# Altium footprint library ref-packages-longpad.PCBLIB: 1527 footprints (part 12 of 103)
Each footprint in its own frame and in the unit in brackets; x right, y up, seen from the top. Pads: shape width x height; smd on the part's side, far side on the other; paste and mask are expansions set on the pad; w line width, h text height; cw(c..) or ccw(c..) is an arc to the next point about the centre after c.
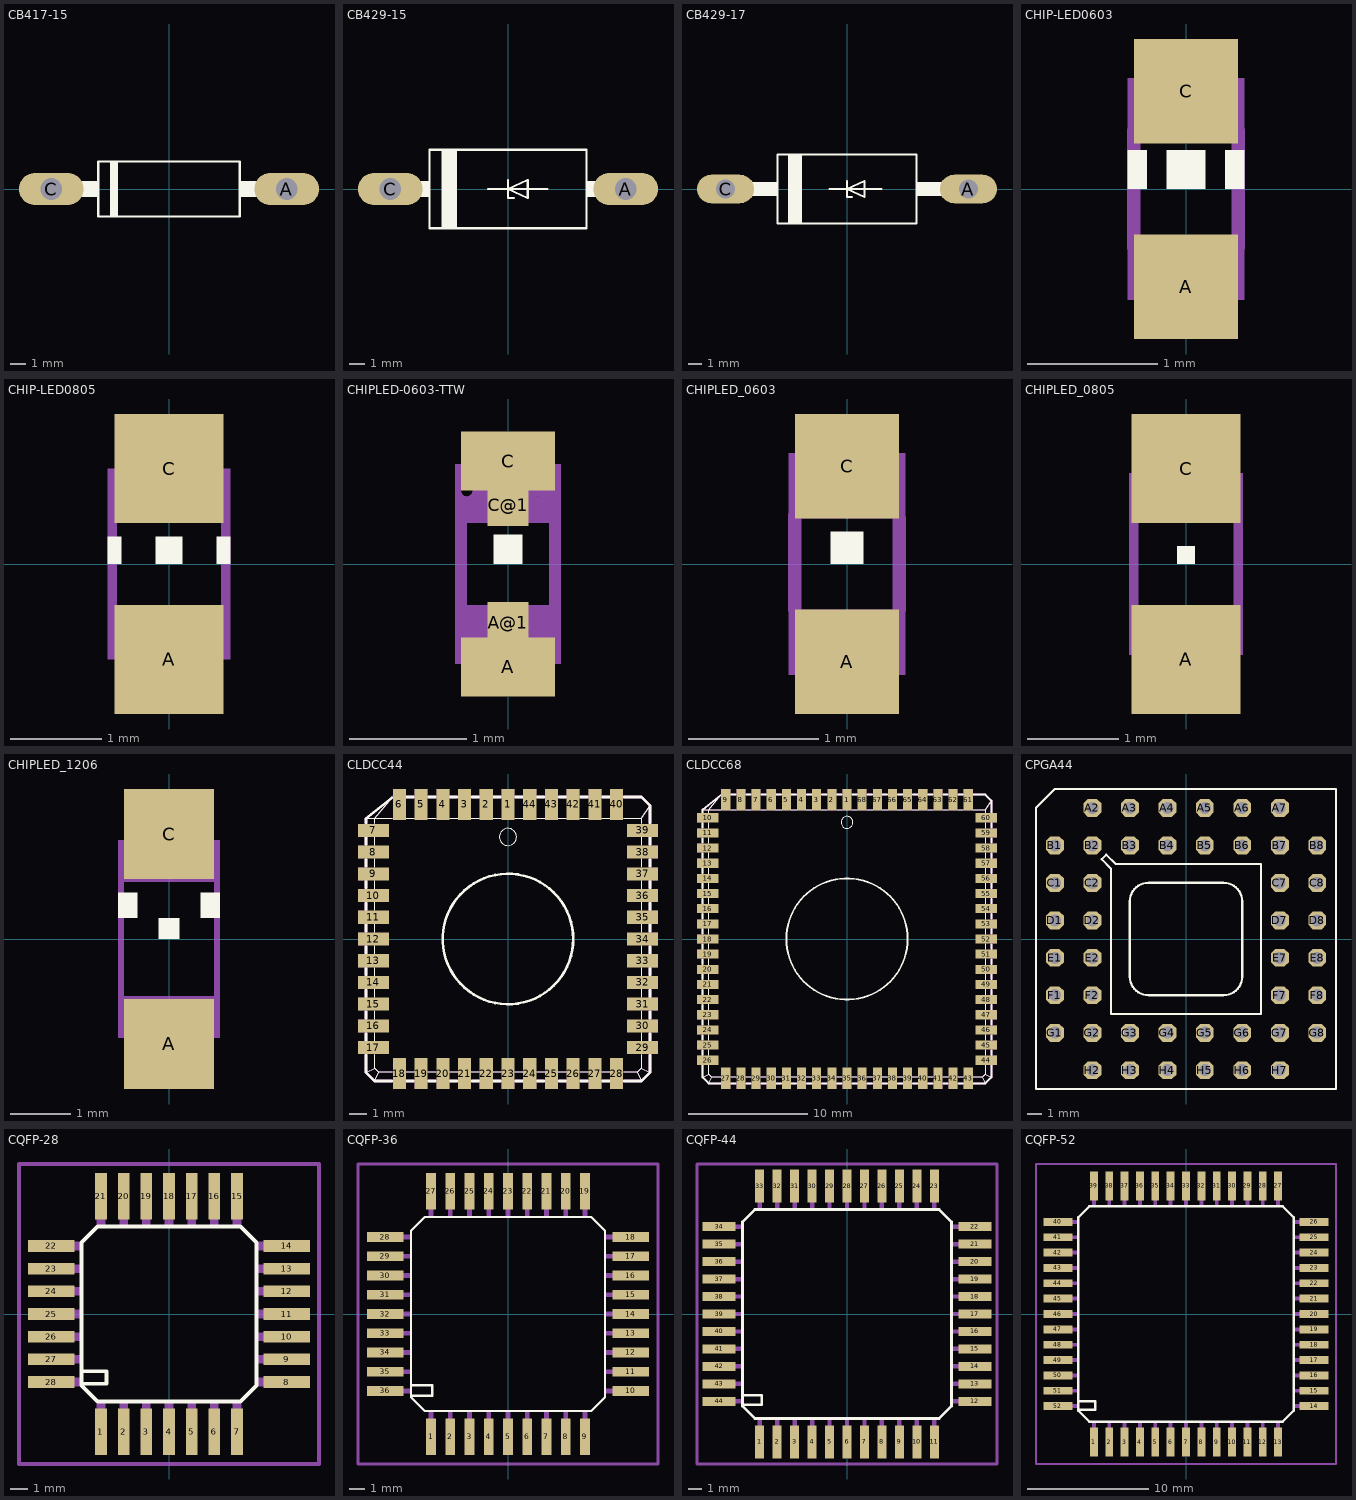
[diagram p11: the footprints below, top view; thin cyan lines are the x and y axes]

## CB417-15 [mil]
pads (2):
  oval 165x82.5 hole 55: A(300,0) C(-300,0)
Top Overlay:
  rectangle: -150,-70 -130,70
  rectangle: 180,-21 245,21
  rectangle: -245,-21 -180,21
  lines w6: -180,-70 -180,70 180,70 180,-70 -180,-70
Mechanical 16:
  lines w44: -300,0 -250,0 ; 250,0 300,0

## CB429-15 [mil]
pads (2):
  oval 165x82.5 hole 55: A(300,0) C(-300,0)
Top Overlay:
  rectangle: -170,-100 -130,100
  rectangle: -235,-20 -200,20
  rectangle: 200,-20 235,20
  lines w6: -50,0 0,0 ; 0,23 0,0 ; 15,-23 0,-23 0,0 ; 100,0 0,0 ; 0,0 50,23 50,-23 0,0 ; -200,-100 -200,100 200,100 200,-100 -200,-100
Mechanical 16:
  lines w40: -300,0 -240,0 ; 240,0 300,0

## CB429-17 [mil]
pads (2):
  oval 165x82.5 hole 55: A(350,0) C(-350,0)
Top Overlay:
  rectangle: -170,-100 -130,100
  rectangle: 200,-20 285,20
  rectangle: -285,-20 -200,20
  lines w6: -50,0 0,0 ; 0,23 0,0 ; 15,-23 0,-23 0,0 ; 100,0 0,0 ; 0,0 50,23 50,-23 0,0 ; -200,-100 -200,100 200,100 200,-100 -200,-100
Mechanical 16:
  lines w40: -350,0 -290,0 ; 290,0 350,0

## CHIP-LED0603 [mil]
pads (2):
  rect 31.5x31.5 smd: A(0,-29.53) C(0,29.53)
Top Overlay:
  rectangle: -17.72,0 -11.81,11.81
  rectangle: 11.81,0 17.72,11.81
  rectangle: -5.91,0 5.91,11.81
Mechanical 16:
  rectangle: -17.72,17.72 17.72,33.46
  rectangle: -17.72,-33.46 17.72,-17.72
  lines w4: -15.75,-17.72 -15.75,17.72 ; 15.75,-17.72 15.75,17.72

## CHIP-LED0805 [mil]
pads (2):
  rect 47.24x47.24 smd: A(0,-41.34) C(0,41.34)
Top Overlay:
  rectangle: -26.57,0 -20.67,11.81
  rectangle: 20.67,0 26.57,11.81
  rectangle: -5.91,0 5.91,11.81
Mechanical 16:
  rectangle: -26.57,17.72 26.57,41.34
  rectangle: -26.57,-41.34 26.57,-17.72
  lines w4: -24.61,-17.72 -24.61,17.72 ; 24.61,-18.7 24.61,17.72

## CHIPLED-0603-TTW [mm]
pads (4):
  rect 0.8x0.5 smd: A(0,-0.875) C(0,0.875)
  rect 0.35x0.35 smd: A@1(0,-0.5) C@1(0,0.5)
Top Overlay:
  rectangle: -0.125,0 0.125,0.25
Top Solder:
  rectangle: -0.175,0.325 0.175,0.7
  rectangle: -0.4,0.625 0.4,1.125
  rectangle: -0.4,-1.125 0.4,-0.625
  rectangle: -0.175,-0.675 0.175,-0.325
Mechanical 16:
  circle w0.051: c-0.35,0.625 r0.075
  rectangle: -0.45,0.7 -0.25,0.85
  rectangle: -0.275,0.55 -0.225,0.6
  rectangle: -0.45,0.35 -0.4,0.725
  rectangle: 0.25,0.55 0.45,0.85
  rectangle: -0.45,0.35 0.45,0.575
  rectangle: -0.45,-0.85 -0.25,-0.35
  rectangle: 0.25,-0.85 0.45,-0.35
  rectangle: -0.275,-0.575 0.275,-0.35
  rectangle: -0.275,-0.65 -0.175,-0.55
  rectangle: 0.175,-0.65 0.275,-0.55
  lines w0.051: -0.275,-0.825 cw(c0,-0.825) 0.275,-0.825
  lines w0.102: -0.4,-0.35 -0.4,0.375 ; -0.3,0.8 ccw(c0,0.826) 0.3,0.8 ; 0.4,-0.35 0.4,0.35

## CHIPLED_0603 [mil]
pads (2):
  rect 31.5x31.5 smd: A(0,-29.53) C(0,29.53)
Top Overlay:
  rectangle: -4.92,0 4.92,9.84
Mechanical 16:
  circle w2: c-13.78,24.61 r2.95
  rectangle: -17.72,27.56 -9.84,33.46
  rectangle: -10.83,21.65 -8.86,23.62
  rectangle: -17.72,13.78 -15.75,28.54
  rectangle: 9.84,21.65 17.72,33.46
  rectangle: -17.72,13.78 17.72,22.64
  rectangle: -17.72,-33.46 -9.84,-13.78
  rectangle: 9.84,-33.46 17.72,-13.78
  rectangle: -10.83,-22.64 10.83,-13.78
  rectangle: -10.83,-25.59 -6.89,-21.65
  rectangle: 6.89,-25.59 10.83,-21.65
  lines w2: -10.83,-32.48 cw(c0,-32.48) 10.83,-32.48
  lines w4: -15.75,-13.78 -15.75,14.76 ; -11.81,31.5 ccw(c0,32.53) 11.81,31.5 ; 15.75,-13.78 15.75,13.78

## CHIPLED_0805 [mil]
pads (2):
  rect 47.24x47.24 smd: A(0,-41.34) C(0,41.34)
Top Overlay:
  rectangle: -3.94,0 3.94,7.87
Mechanical 16:
  circle w4: c-17.72,33.46 r4.06
  rectangle: 11.81,19.69 24.61,39.37
  rectangle: -12.8,19.69 -6.89,29.53
  rectangle: 6.89,19.69 12.8,29.53
  rectangle: -7.87,19.69 7.87,26.57
  rectangle: 11.81,-39.37 24.61,-19.69
  rectangle: -24.61,-39.37 -11.81,-19.69
  rectangle: 6.89,-29.53 12.8,-19.69
  rectangle: -12.8,-29.53 -6.89,-19.69
  rectangle: -7.87,-26.57 7.87,-19.69
  rectangle: -23.62,19.69 -11.81,31.5
  rectangle: -24.61,36.42 -13.78,39.37
  lines w4: -22.64,-19.69 -22.64,36.42 ; -13.78,-37.4 cw(c0,-38.42) 13.78,-37.4 ; -13.78,37.4 ccw(c0,38.42) 13.78,37.4 ; 22.64,-20.67 22.64,20.67

## CHIPLED_1206 [mil]
pads (2):
  rect 59.06x59.06 smd: A(0,-68.9) C(0,68.9)
Top Overlay:
  rectangle: -33.46,13.78 -20.67,30.51
  rectangle: 20.67,13.78 33.46,30.51
  rectangle: -6.89,0 6.89,13.78
Mechanical 16:
  circle w4: c-21.65,56.1 r3.94
  rectangle: -33.46,60.04 -13.78,64.96
  rectangle: -33.46,48.23 -24.61,61.02
  rectangle: -17.72,48.23 -12.8,57.09
  rectangle: -25.59,48.23 -8.86,53.15
  rectangle: 13.78,51.18 33.46,64.96
  rectangle: 9.84,48.23 33.46,53.15
  rectangle: -33.46,37.4 33.46,49.21
  rectangle: -33.46,-64.96 33.46,-37.4
  lines w4: -31.5,-37.4 -31.5,37.4 ; -15.75,62.99 ccw(c0,64.01) 15.75,62.99 ; 31.5,-37.4 31.5,37.4

## CLDCC44 [mil]
pads (44):
  rect 29.92x70.87 smd: 1(0,309.45) 2(-50,309.45) 3(-100,309.45) 4(-150,309.45) 5(-200,309.45) 6(-250,309.45) 18(-250,-309.45) 19(-200,-309.45) 20(-150,-309.45) 21(-100,-309.45) 22(-50,-309.45) 23(0,-309.45) 24(50,-309.45) 25(100,-309.45) 26(150,-309.45) 27(200,-309.45) 28(250,-309.45) 40(250,309.45) 41(200,309.45) 42(150,309.45) 43(100,309.45) 44(50,309.45)
  rect 70.87x29.92 smd: 7(-309.45,250) 8(-309.45,200) 9(-309.45,150) 10(-309.45,100) 11(-309.45,50) 12(-309.45,0) 13(-309.45,-50) 14(-309.45,-100) 15(-309.45,-150) 16(-309.45,-200) 17(-309.45,-250) 29(309.45,-250) 30(309.45,-200) 31(309.45,-150) 32(309.45,-100) 33(309.45,-50) 34(309.45,0) 35(309.45,50) 36(309.45,100) 37(309.45,150) 38(309.45,200) 39(309.45,250)
Top Overlay:
  circle w2: c0,234.65 r19.69
  circle w6: c0,0 r150
  lines w2: -326.38,-306.69 -306.69,-296.85 ; -326.38,277.17 -306.69,277.17 ; -306.69,-326.38 -296.85,-306.69 ; -306.69,-265.75 -306.69,-296.85 ; -306.69,-234.25 -306.69,-215.75 ; -306.69,-184.25 -306.69,-165.75 ; -306.69,-134.25 -306.69,-115.75 ; -306.69,-84.25 -306.69,-65.75 ; -306.69,-34.25 -306.69,-15.75 ; -306.69,15.75 -306.69,34.25 ; -306.69,65.75 -306.69,84.25 ; -306.69,115.75 -306.69,134.25 ; -306.69,165.75 -306.69,184.25 ; -306.69,215.75 -306.69,234.25 ; -306.69,265.75 -306.69,277.17 ; -265.75,-306.69 -296.85,-306.69 ; -265.75,277.17 -306.69,277.17 ; -265.75,325.59 -306.69,277.17 ; -234.25,-306.69 -215.75,-306.69 ; -234.25,277.17 -215.75,277.17 ; -184.25,-306.69 -165.75,-306.69 ; -184.25,277.17 -165.75,277.17 ; -134.25,-306.69 -115.75,-306.69 ; -134.25,277.17 -115.75,277.17 ; -84.25,-306.69 -65.75,-306.69 ; -84.25,277.17 -65.75,277.17 ; -34.25,-306.69 -15.75,-306.69 ; -34.25,277.17 -15.75,277.17 ; 15.75,-306.69 34.25,-306.69 ; 15.75,277.17 34.25,277.17 ; 65.75,-306.69 84.25,-306.69 ; 65.75,277.17 84.25,277.17 ; 115.75,-306.69 134.25,-306.69 ; 115.75,277.17 134.25,277.17 ; 165.75,-306.69 184.25,-306.69 ; 165.75,277.17 184.25,277.17 ; 215.75,-306.69 234.25,-306.69 ; 215.75,277.17 234.25,277.17 ; 265.75,-306.69 296.85,-306.69 ; 265.75,277.17 306.69,277.17 ; 306.69,-326.38 296.85,-306.69 ; 306.69,-265.75 306.69,-296.85 ; 306.69,-234.25 306.69,-215.75 ; 306.69,-184.25 306.69,-165.75 ; 306.69,-134.25 306.69,-115.75 ; 306.69,-84.25 306.69,-65.75 ; 306.69,-34.25 306.69,-15.75 ; 306.69,15.75 306.69,34.25 ; 306.69,65.75 306.69,84.25 ; 306.69,115.75 306.69,134.25 ; 306.69,165.75 306.69,184.25 ; 306.69,215.75 306.69,234.25 ; 306.69,265.75 306.69,277.17 ; 326.38,-306.69 306.69,-296.85 ; 326.38,306.69 306.69,277.17 ; -306.69,-296.85 -296.85,-306.69 ; 296.85,-306.69 306.69,-296.85
  lines w6: -326.38,-267.32 -326.38,-306.69 -306.69,-326.38 -267.32,-326.38 ; -326.38,-232.68 -326.38,-217.32 ; -326.38,-182.68 -326.38,-167.32 ; -326.38,-132.68 -326.38,-117.32 ; -326.38,-82.68 -326.38,-67.32 ; -326.38,-32.68 -326.38,-17.32 ; -326.38,17.32 -326.38,32.68 ; -326.38,67.32 -326.38,82.68 ; -326.38,117.32 -326.38,132.68 ; -326.38,167.32 -326.38,182.68 ; -326.38,217.32 -326.38,232.68 ; -326.38,267.32 -326.38,277.17 -267.32,324.41 ; -232.68,-326.38 -217.32,-326.38 ; -232.68,326.38 -217.32,326.38 ; -182.68,-326.38 -167.32,-326.38 ; -182.68,326.38 -167.32,326.38 ; -132.68,-326.38 -117.32,-326.38 ; -132.68,326.38 -117.32,326.38 ; -82.68,-326.38 -67.32,-326.38 ; -82.68,326.38 -67.32,326.38 ; -32.68,-326.38 -17.32,-326.38 ; -32.68,326.38 -17.32,326.38 ; 17.32,-326.38 32.68,-326.38 ; 17.32,326.38 32.68,326.38 ; 67.32,-326.38 82.68,-326.38 ; 67.32,326.38 82.68,326.38 ; 117.32,-326.38 132.68,-326.38 ; 117.32,326.38 132.68,326.38 ; 167.32,-326.38 182.68,-326.38 ; 167.32,326.38 182.68,326.38 ; 217.32,-326.38 232.68,-326.38 ; 217.32,326.38 232.68,326.38 ; 267.32,-326.38 306.69,-326.38 326.38,-306.69 326.38,-267.32 ; 267.32,326.38 306.69,326.38 326.38,306.69 326.38,267.32 ; 326.38,-232.68 326.38,-217.32 ; 326.38,-182.68 326.38,-167.32 ; 326.38,-132.68 326.38,-117.32 ; 326.38,-82.68 326.38,-67.32 ; 326.38,-32.68 326.38,-17.32 ; 326.38,17.32 326.38,32.68 ; 326.38,67.32 326.38,82.68 ; 326.38,117.32 326.38,132.68 ; 326.38,167.32 326.38,182.68 ; 326.38,217.32 326.38,232.68
Mechanical 16:
  rectangle: 326.38,85.04 344.88,114.96
  rectangle: 326.38,35.04 344.88,64.96
  rectangle: 326.38,-14.96 344.88,14.96
  rectangle: 326.38,-64.96 344.88,-35.04
  rectangle: 326.38,-114.96 344.88,-85.04
  rectangle: 326.38,-164.96 344.88,-135.04
  rectangle: 326.38,-214.96 344.88,-185.04
  rectangle: 135.04,-344.88 164.96,-326.38
  rectangle: 85.04,-344.88 114.96,-326.38
  rectangle: 35.04,-344.88 64.96,-326.38
  rectangle: -14.96,-344.88 14.96,-326.38
  rectangle: -64.96,-344.88 -35.04,-326.38
  rectangle: -114.96,-344.88 -85.04,-326.38
  rectangle: -264.96,-344.88 -235.04,-326.38
  rectangle: -344.88,185.04 -326.38,214.96
  rectangle: -344.88,135.04 -326.38,164.96
  rectangle: -344.88,85.04 -326.38,114.96
  rectangle: -344.88,35.04 -326.38,64.96
  rectangle: -344.88,-14.96 -326.38,14.96
  rectangle: -344.88,-64.96 -326.38,-35.04
  rectangle: -344.88,-114.96 -326.38,-85.04
  rectangle: 135.04,326.38 164.96,344.88
  rectangle: 85.04,326.38 114.96,344.88
  rectangle: 35.04,326.38 64.96,344.88
  rectangle: -14.96,326.38 14.96,344.88
  rectangle: -64.96,326.38 -35.04,344.88
  rectangle: -114.96,326.38 -85.04,344.88
  rectangle: -264.96,326.38 -235.04,344.88
  rectangle: 326.38,135.04 344.88,164.96
  rectangle: 326.38,185.04 344.88,214.96
  rectangle: -344.88,-164.96 -326.38,-135.04
  rectangle: -344.88,-214.96 -326.38,-185.04
  rectangle: 185.04,326.38 214.96,344.88
  rectangle: 235.04,326.38 264.96,344.88
  rectangle: -164.96,326.38 -135.04,344.88
  rectangle: -214.96,326.38 -185.04,344.88
  rectangle: -344.88,-264.96 -326.38,-235.04
  rectangle: -214.96,-344.88 -185.04,-326.38
  rectangle: -164.96,-344.88 -135.04,-326.38
  rectangle: 185.04,-344.88 214.96,-326.38
  rectangle: 235.04,-344.88 264.96,-326.38
  rectangle: 326.38,-264.96 344.88,-235.04
  rectangle: 326.38,235.04 344.88,264.96
  rectangle: -344.88,235.04 -326.38,264.96
  lines w2: -326.38,-306.69 -306.69,-296.85 ; -326.38,277.17 -306.69,277.17 ; -306.69,-326.38 -296.85,-306.69 ; -264.96,326.38 -306.69,277.17 ; 306.69,-326.38 296.85,-306.69 ; 326.38,-306.69 306.69,-296.85 ; 326.38,306.69 306.69,277.17 ; -306.69,-296.85 -296.85,-306.69 ; -306.69,-296.85 -306.69,277.17 ; -306.69,277.17 306.69,277.17 ; -296.85,-306.69 296.85,-306.69 ; 296.85,-306.69 306.69,-296.85 ; 306.69,-296.85 306.69,277.17
  lines w6: -326.38,-306.69 -306.69,-326.38 306.69,-326.38 326.38,-306.69 326.38,306.69 306.69,326.38 -264.96,326.38 -326.38,277.17 -326.38,-306.69

## CLDCC68 [mil]
pads (68):
  rect 29.92x70.87 smd: 1(0,459.45) 2(-50,459.45) 3(-100,459.45) 4(-150,459.45) 5(-200,459.45) 6(-250,459.45) 7(-300,459.45) 8(-350,459.45) 9(-400,459.45) 27(-400,-459.45) 28(-350,-459.45) 29(-300,-459.45) 30(-250,-459.45) 31(-200,-459.45) 32(-150,-459.45) 33(-100,-459.45) 34(-50,-459.45) 35(0,-459.45) 36(50,-459.45) 37(100,-459.45) 38(150,-459.45) 39(200,-459.45) 40(250,-459.45) 41(300,-459.45) 42(350,-459.45) 43(400,-459.45) 61(400,459.45) 62(350,459.45) 63(300,459.45) 64(250,459.45) 65(200,459.45) 66(150,459.45) 67(100,459.45) 68(50,459.45)
  rect 70.87x29.92 smd: 10(-459.45,400) 11(-459.45,350) 12(-459.45,300) 13(-459.45,250) 14(-459.45,200) 15(-459.45,150) 16(-459.45,100) 17(-459.45,50) 18(-459.45,0) 19(-459.45,-50) 20(-459.45,-100) 21(-459.45,-150) 22(-459.45,-200) 23(-459.45,-250) 24(-459.45,-300) 25(-459.45,-350) 26(-459.45,-400) 44(459.45,-400) 45(459.45,-350) 46(459.45,-300) 47(459.45,-250) 48(459.45,-200) 49(459.45,-150) 50(459.45,-100) 51(459.45,-50) 52(459.45,0) 53(459.45,50) 54(459.45,100) 55(459.45,150) 56(459.45,200) 57(459.45,250) 58(459.45,300) 59(459.45,350) 60(459.45,400)
Top Overlay:
  drawing of 158 lines, arcs and shapes, not listed
Mechanical 16:
  rectangle: 476.38,85.04 494.88,114.96
  rectangle: 476.38,35.04 494.88,64.96
  rectangle: 476.38,-14.96 494.88,14.96
  rectangle: 476.38,-64.96 494.88,-35.04
  rectangle: 476.38,-114.96 494.88,-85.04
  rectangle: 476.38,-164.96 494.88,-135.04
  rectangle: 476.38,-214.96 494.88,-185.04
  rectangle: 135.04,-494.88 164.96,-476.38
  rectangle: 85.04,-494.88 114.96,-476.38
  rectangle: 35.04,-494.88 64.96,-476.38
  rectangle: -14.96,-494.88 14.96,-476.38
  rectangle: -64.96,-494.88 -35.04,-476.38
  rectangle: -114.96,-494.88 -85.04,-476.38
  rectangle: -414.96,-494.88 -385.04,-476.38
  rectangle: -494.88,185.04 -476.38,214.96
  rectangle: -494.88,135.04 -476.38,164.96
  rectangle: -494.88,85.04 -476.38,114.96
  rectangle: -494.88,35.04 -476.38,64.96
  rectangle: -494.88,-14.96 -476.38,14.96
  rectangle: -494.88,-64.96 -476.38,-35.04
  rectangle: -494.88,-114.96 -476.38,-85.04
  rectangle: 135.04,476.38 164.96,494.88
  rectangle: 85.04,476.38 114.96,494.88
  rectangle: 35.04,476.38 64.96,494.88
  rectangle: -14.96,476.38 14.96,494.88
  rectangle: -64.96,476.38 -35.04,494.88
  rectangle: -114.96,476.38 -85.04,494.88
  rectangle: -414.96,476.38 -385.04,494.88
  rectangle: 476.38,135.04 494.88,164.96
  rectangle: 476.38,185.04 494.88,214.96
  rectangle: -494.88,-164.96 -476.38,-135.04
  rectangle: -494.88,-214.96 -476.38,-185.04
  rectangle: 185.04,476.38 214.96,494.88
  rectangle: 235.04,476.38 264.96,494.88
  rectangle: -164.96,476.38 -135.04,494.88
  rectangle: -214.96,476.38 -185.04,494.88
  rectangle: -494.88,-264.96 -476.38,-235.04
  rectangle: -214.96,-494.88 -185.04,-476.38
  rectangle: -164.96,-494.88 -135.04,-476.38
  rectangle: 185.04,-494.88 214.96,-476.38
  rectangle: 235.04,-494.88 264.96,-476.38
  rectangle: 476.38,-264.96 494.88,-235.04
  rectangle: 476.38,235.04 494.88,264.96
  rectangle: -494.88,235.04 -476.38,264.96
  rectangle: -264.96,-494.88 -235.04,-476.38
  rectangle: -314.96,-494.88 -285.04,-476.38
  rectangle: -364.96,-494.88 -335.04,-476.38
  rectangle: -494.88,-314.96 -476.38,-285.04
  rectangle: -494.88,-364.96 -476.38,-335.04
  rectangle: -494.88,-414.96 -476.38,-385.04
  rectangle: -494.88,285.04 -476.38,314.96
  rectangle: -494.88,335.04 -476.38,364.96
  rectangle: -494.88,385.04 -476.38,414.96
  rectangle: -264.96,476.38 -235.04,494.88
  rectangle: -314.96,476.38 -285.04,494.88
  rectangle: -364.96,476.38 -335.04,494.88
  rectangle: 476.38,285.04 494.88,314.96
  rectangle: 476.38,335.04 494.88,364.96
  rectangle: 476.38,385.04 494.88,414.96
  rectangle: 285.04,476.38 314.96,494.88
  rectangle: 335.04,476.38 364.96,494.88
  rectangle: 385.04,476.38 414.96,494.88
  rectangle: 476.38,-314.96 494.88,-285.04
  rectangle: 476.38,-364.96 494.88,-335.04
  rectangle: 476.38,-414.96 494.88,-385.04
  rectangle: 285.04,-494.88 314.96,-476.38
  rectangle: 335.04,-494.88 364.96,-476.38
  rectangle: 385.04,-494.88 414.96,-476.38
  lines w2: -476.38,-456.69 -456.69,-446.85 ; -476.38,427.17 -456.69,427.17 ; -456.69,-476.38 -446.85,-456.69 ; -414.96,476.38 -456.69,427.17 ; 456.69,-476.38 446.85,-456.69 ; 476.38,-456.69 456.69,-446.85 ; 476.38,456.69 456.69,427.17 ; -456.69,-446.85 -446.85,-456.69 ; -456.69,-446.85 -456.69,427.17 ; -456.69,427.17 456.69,427.17 ; -446.85,-456.69 446.85,-456.69 ; 446.85,-456.69 456.69,-446.85 ; 456.69,-446.85 456.69,427.17
  lines w6: -476.38,-456.69 -456.69,-476.38 456.69,-476.38 476.38,-456.69 476.38,456.69 456.69,476.38 -414.96,476.38 -476.38,427.17 -476.38,-456.69

## CPGA44 [mil]
pads (44):
  oct 48x48 hole 32: A2(-250,350) A3(-150,350) A4(-50,350) A5(50,350) A6(150,350) A7(250,350) B1(-350,250) B2(-250,250) B3(-150,250) B4(-50,250) B5(50,250) B6(150,250) B7(250,250) B8(350,250) C1(-350,150) C2(-250,150) C7(250,150) C8(350,150) D1(-350,50) D2(-250,50) D7(250,50) D8(350,50) E1(-350,-50) E2(-250,-50) E7(250,-50) E8(350,-50) F1(-350,-150) F2(-250,-150) F7(250,-150) F8(350,-150) G1(-350,-250) G2(-250,-250) G3(-150,-250) G4(-50,-250) G5(50,-250) G6(150,-250) G7(250,-250) G8(350,-250) H2(-250,-350) H3(-150,-350) H4(-50,-350) H5(50,-350) H6(150,-350) H7(250,-350)
Top Overlay:
  lines w6: -400,-400 -400,350 -350,400 400,400 400,-400 -400,-400 ; -225,212.5 -200,187.5 -200,-200 200,-200 200,200 -187.5,200 -212.5,225 -225,212.5 ; -150,-100 -150,100 cw(c-100,100) -100,150 100,150 cw(c100,100) 150,100 150,-100 cw(c100,-100) 100,-150 -100,-150 cw(c-100,-100) -150,-100

## CQFP-28 [mm]
pads (28):
  rect 0.65x2.6 smd: 1(-3.81,-6.6) 2(-2.54,-6.6) 3(-1.27,-6.6) 4(0,-6.6) 5(1.27,-6.6) 6(2.54,-6.6) 7(3.81,-6.6) 15(3.81,6.6) 16(2.54,6.6) 17(1.27,6.6) 18(0,6.6) 19(-1.27,6.6) 20(-2.54,6.6) 21(-3.81,6.6)
  rect 2.6x0.65 smd: 8(6.6,-3.81) 9(6.6,-2.54) 10(6.6,-1.27) 11(6.6,0) 12(6.6,1.27) 13(6.6,2.54) 14(6.6,3.81) 22(-6.6,3.81) 23(-6.6,2.54) 24(-6.6,1.27) 25(-6.6,0) 26(-6.6,-1.27) 27(-6.6,-2.54) 28(-6.6,-3.81)
Top Overlay:
  lines w0.203: -4.8,-3.2 -3.5,-3.2 -3.5,-3.9 -4.9,-3.9 ; -4.9,-3.9 -4.9,4 -4,4.9 4,4.9 4.9,4 4.9,-4 4,-4.9 -4,-4.9 -4.9,-4 -4.9,-3.9
Mechanical 16:
  rectangle: -4.05,-7.4 -3.57,-4.91
  rectangle: -2.78,-7.4 -2.3,-4.91
  rectangle: -1.51,-7.4 -1.03,-4.91
  rectangle: -0.24,-7.4 0.24,-4.91
  rectangle: 1.03,-7.4 1.51,-4.91
  rectangle: 2.3,-7.4 2.78,-4.91
  rectangle: 3.57,-7.4 4.05,-4.91
  rectangle: 4.91,-4.05 7.4,-3.57
  rectangle: 4.91,-2.78 7.4,-2.3
  rectangle: 4.91,-1.51 7.4,-1.03
  rectangle: 4.91,-0.24 7.4,0.24
  rectangle: 4.91,1.03 7.4,1.51
  rectangle: 4.91,2.3 7.4,2.78
  rectangle: 4.91,3.57 7.4,4.05
  rectangle: 3.57,4.91 4.05,7.4
  rectangle: 2.3,4.91 2.78,7.4
  rectangle: 1.03,4.91 1.51,7.4
  rectangle: -0.24,4.91 0.24,7.4
  rectangle: -1.51,4.91 -1.03,7.4
  rectangle: -2.78,4.91 -2.3,7.4
  rectangle: -4.05,4.91 -3.57,7.4
  rectangle: -7.4,3.57 -4.91,4.05
  rectangle: -7.4,2.3 -4.91,2.78
  rectangle: -7.4,1.03 -4.91,1.51
  rectangle: -7.4,-0.24 -4.91,0.24
  rectangle: -7.4,-1.51 -4.91,-1.03
  rectangle: -7.4,-2.78 -4.91,-2.3
  rectangle: -7.4,-4.05 -4.91,-3.57
Mechanical 27:
  lines w0.2: -8.403,-8.403 8.403,-8.403 8.403,8.403 -8.403,8.403 -8.403,-8.403

## CQFP-36 [mm]
pads (36):
  rect 0.65x2.4 smd: 1(-5.08,-8.1) 2(-3.81,-8.1) 3(-2.54,-8.1) 4(-1.27,-8.1) 5(0,-8.1) 6(1.27,-8.1) 7(2.54,-8.1) 8(3.81,-8.1) 9(5.08,-8.1) 19(5.08,8.1) 20(3.81,8.1) 21(2.54,8.1) 22(1.27,8.1) 23(0,8.1) 24(-1.27,8.1) 25(-2.54,8.1) 26(-3.81,8.1) 27(-5.08,8.1)
  rect 2.4x0.65 smd: 10(8.1,-5.08) 11(8.1,-3.81) 12(8.1,-2.54) 13(8.1,-1.27) 14(8.1,0) 15(8.1,1.27) 16(8.1,2.54) 17(8.1,3.81) 18(8.1,5.08) 28(-8.1,5.08) 29(-8.1,3.81) 30(-8.1,2.54) 31(-8.1,1.27) 32(-8.1,0) 33(-8.1,-1.27) 34(-8.1,-2.54) 35(-8.1,-3.81) 36(-8.1,-5.08)
Top Overlay:
  lines w0.152: -6.3,-4.7 -5,-4.7 -5,-5.4 -6.4,-5.4 ; -6.4,-5.4 -6.4,5.5 -5.5,6.4 5.5,6.4 6.4,5.5 6.4,-5.5 5.5,-6.4 -5.5,-6.4 -6.4,-5.5 -6.4,-5.4
Mechanical 16:
  rectangle: -5.24,-8.9 -4.92,-6.4
  rectangle: -3.97,-8.9 -3.65,-6.4
  rectangle: -2.7,-8.9 -2.38,-6.4
  rectangle: -1.43,-8.9 -1.11,-6.4
  rectangle: -0.16,-8.9 0.16,-6.4
  rectangle: 1.11,-8.9 1.43,-6.4
  rectangle: 2.38,-8.9 2.7,-6.4
  rectangle: 3.65,-8.9 3.97,-6.4
  rectangle: 4.92,-8.9 5.24,-6.4
  rectangle: 6.4,-5.24 8.9,-4.92
  rectangle: 6.4,-3.97 8.9,-3.65
  rectangle: 6.4,-2.7 8.9,-2.38
  rectangle: 6.4,-1.43 8.9,-1.11
  rectangle: 6.4,-0.16 8.9,0.16
  rectangle: 6.4,1.11 8.9,1.43
  rectangle: 6.4,2.38 8.9,2.7
  rectangle: 6.4,3.65 8.9,3.97
  rectangle: 6.4,4.92 8.9,5.24
  rectangle: 4.92,6.4 5.24,8.9
  rectangle: 3.65,6.4 3.97,8.9
  rectangle: 2.38,6.4 2.7,8.9
  rectangle: 1.11,6.4 1.43,8.9
  rectangle: -0.16,6.4 0.16,8.9
  rectangle: -1.43,6.4 -1.11,8.9
  rectangle: -2.7,6.4 -2.38,8.9
  rectangle: -3.97,6.4 -3.65,8.9
  rectangle: -5.24,6.4 -4.92,8.9
  rectangle: -8.9,4.92 -6.4,5.24
  rectangle: -8.9,3.65 -6.4,3.97
  rectangle: -8.9,2.38 -6.4,2.7
  rectangle: -8.9,1.11 -6.4,1.43
  rectangle: -8.9,-0.16 -6.4,0.16
  rectangle: -8.9,-1.43 -6.4,-1.11
  rectangle: -8.9,-2.7 -6.4,-2.38
  rectangle: -8.9,-3.97 -6.4,-3.65
  rectangle: -8.9,-5.24 -6.4,-4.92
Mechanical 27:
  lines w0.2: -9.903,-9.903 9.903,-9.903 9.903,9.903 -9.903,9.903 -9.903,-9.903

## CQFP-44 [mm]
pads (44):
  rect 0.65x2.4 smd: 1(-6.35,-9.3) 2(-5.08,-9.3) 3(-3.81,-9.3) 4(-2.54,-9.3) 5(-1.27,-9.3) 6(0,-9.3) 7(1.27,-9.3) 8(2.54,-9.3) 9(3.81,-9.3) 10(5.08,-9.3) 11(6.35,-9.3) 23(6.35,9.3) 24(5.08,9.3) 25(3.81,9.3) 26(2.54,9.3) 27(1.27,9.3) 28(0,9.3) 29(-1.27,9.3) 30(-2.54,9.3) 31(-3.81,9.3) 32(-5.08,9.3) 33(-6.35,9.3)
  rect 2.4x0.65 smd: 12(9.3,-6.35) 13(9.3,-5.08) 14(9.3,-3.81) 15(9.3,-2.54) 16(9.3,-1.27) 17(9.3,0) 18(9.3,1.27) 19(9.3,2.54) 20(9.3,3.81) 21(9.3,5.08) 22(9.3,6.35) 34(-9.3,6.35) 35(-9.3,5.08) 36(-9.3,3.81) 37(-9.3,2.54) 38(-9.3,1.27) 39(-9.3,0) 40(-9.3,-1.27) 41(-9.3,-2.54) 42(-9.3,-3.81) 43(-9.3,-5.08) 44(-9.3,-6.35)
Top Overlay:
  lines w0.203: -7.5,-5.9 -6.2,-5.9 -6.2,-6.6 -7.6,-6.6 ; -7.6,-6.6 -7.6,6.7 -6.7,7.6 6.7,7.6 7.6,6.7 7.6,-6.7 6.7,-7.6 -6.7,-7.6 -7.6,-6.7 -7.6,-6.6
Mechanical 16:
  rectangle: -6.51,-10.1 -6.19,-7.6
  rectangle: -5.24,-10.1 -4.92,-7.6
  rectangle: -3.97,-10.1 -3.65,-7.6
  rectangle: -2.7,-10.1 -2.38,-7.6
  rectangle: -1.43,-10.1 -1.11,-7.6
  rectangle: -0.16,-10.1 0.16,-7.6
  rectangle: 1.11,-10.1 1.43,-7.6
  rectangle: 2.38,-10.1 2.7,-7.6
  rectangle: 3.65,-10.1 3.97,-7.6
  rectangle: 4.92,-10.1 5.24,-7.6
  rectangle: 6.19,-10.1 6.51,-7.6
  rectangle: 7.6,-6.51 10.1,-6.19
  rectangle: 7.6,-5.24 10.1,-4.92
  rectangle: 7.6,-3.97 10.1,-3.65
  rectangle: 7.6,-2.7 10.1,-2.38
  rectangle: 7.6,-1.43 10.1,-1.11
  rectangle: 7.6,-0.16 10.1,0.16
  rectangle: 7.6,1.11 10.1,1.43
  rectangle: 7.6,2.38 10.1,2.7
  rectangle: 7.6,3.65 10.1,3.97
  rectangle: 7.6,4.92 10.1,5.24
  rectangle: 7.6,6.19 10.1,6.51
  rectangle: 6.19,7.6 6.51,10.1
  rectangle: 4.92,7.6 5.24,10.1
  rectangle: 3.65,7.6 3.97,10.1
  rectangle: 2.38,7.6 2.7,10.1
  rectangle: 1.11,7.6 1.43,10.1
  rectangle: -0.16,7.6 0.16,10.1
  rectangle: -1.43,7.6 -1.11,10.1
  rectangle: -2.7,7.6 -2.38,10.1
  rectangle: -3.97,7.6 -3.65,10.1
  rectangle: -5.24,7.6 -4.92,10.1
  rectangle: -6.51,7.6 -6.19,10.1
  rectangle: -10.1,6.19 -7.6,6.51
  rectangle: -10.1,4.92 -7.6,5.24
  rectangle: -10.1,3.65 -7.6,3.97
  rectangle: -10.1,2.38 -7.6,2.7
  rectangle: -10.1,1.11 -7.6,1.43
  rectangle: -10.1,-0.16 -7.6,0.16
  rectangle: -10.1,-1.43 -7.6,-1.11
  rectangle: -10.1,-2.7 -7.6,-2.38
  rectangle: -10.1,-3.97 -7.6,-3.65
  rectangle: -10.1,-5.24 -7.6,-4.92
  rectangle: -10.1,-6.51 -7.6,-6.19
Mechanical 27:
  lines w0.2: -10.903,-10.903 10.903,-10.903 10.903,10.903 -10.903,10.903 -10.903,-10.903

## CQFP-52 [mm]
pads (52):
  rect 0.65x2.4 smd: 1(-7.62,-10.6) 2(-6.35,-10.6) 3(-5.08,-10.6) 4(-3.81,-10.6) 5(-2.54,-10.6) 6(-1.27,-10.6) 7(0,-10.6) 8(1.27,-10.6) 9(2.54,-10.6) 10(3.81,-10.6) 11(5.08,-10.6) 12(6.35,-10.6) 13(7.62,-10.6) 27(7.62,10.6) 28(6.35,10.6) 29(5.08,10.6) 30(3.81,10.6) 31(2.54,10.6) 32(1.27,10.6) 33(0,10.6) 34(-1.27,10.6) 35(-2.54,10.6) 36(-3.81,10.6) 37(-5.08,10.6) 38(-6.35,10.6) 39(-7.62,10.6)
  rect 2.4x0.65 smd: 14(10.6,-7.62) 15(10.6,-6.35) 16(10.6,-5.08) 17(10.6,-3.81) 18(10.6,-2.54) 19(10.6,-1.27) 20(10.6,0) 21(10.6,1.27) 22(10.6,2.54) 23(10.6,3.81) 24(10.6,5.08) 25(10.6,6.35) 26(10.6,7.62) 40(-10.6,7.62) 41(-10.6,6.35) 42(-10.6,5.08) 43(-10.6,3.81) 44(-10.6,2.54) 45(-10.6,1.27) 46(-10.6,0) 47(-10.6,-1.27) 48(-10.6,-2.54) 49(-10.6,-3.81) 50(-10.6,-5.08) 51(-10.6,-6.35) 52(-10.6,-7.62)
Top Overlay:
  lines w0.203: -8.8,-7.2 -7.5,-7.2 -7.5,-7.9 -8.9,-7.9 ; -8.9,-7.9 -8.9,8 -8,8.9 8,8.9 8.9,8 8.9,-8 8,-8.9 -8,-8.9 -8.9,-8 -8.9,-7.9
Mechanical 16:
  rectangle: -7.78,-11.4 -7.46,-8.9
  rectangle: -6.51,-11.4 -6.19,-8.9
  rectangle: -5.24,-11.4 -4.92,-8.9
  rectangle: -3.97,-11.4 -3.65,-8.9
  rectangle: -2.7,-11.4 -2.38,-8.9
  rectangle: -1.43,-11.4 -1.11,-8.9
  rectangle: -0.16,-11.4 0.16,-8.9
  rectangle: 1.11,-11.4 1.43,-8.9
  rectangle: 2.38,-11.4 2.7,-8.9
  rectangle: 3.65,-11.4 3.97,-8.9
  rectangle: 4.92,-11.4 5.24,-8.9
  rectangle: 6.19,-11.4 6.51,-8.9
  rectangle: 7.46,-11.4 7.78,-8.9
  rectangle: 8.9,-7.78 11.4,-7.46
  rectangle: 8.9,-6.51 11.4,-6.19
  rectangle: 8.9,-5.24 11.4,-4.92
  rectangle: 8.9,-3.97 11.4,-3.65
  rectangle: 8.9,-2.7 11.4,-2.38
  rectangle: 8.9,-1.43 11.4,-1.11
  rectangle: 8.9,-0.16 11.4,0.16
  rectangle: 8.9,1.11 11.4,1.43
  rectangle: 8.9,2.38 11.4,2.7
  rectangle: 8.9,3.65 11.4,3.97
  rectangle: 8.9,4.92 11.4,5.24
  rectangle: 8.9,6.19 11.4,6.51
  rectangle: 8.9,7.46 11.4,7.78
  rectangle: 7.46,8.9 7.78,11.4
  rectangle: 6.19,8.9 6.51,11.4
  rectangle: 4.92,8.9 5.24,11.4
  rectangle: 3.65,8.9 3.97,11.4
  rectangle: 2.38,8.9 2.7,11.4
  rectangle: 1.11,8.9 1.43,11.4
  rectangle: -0.16,8.9 0.16,11.4
  rectangle: -1.43,8.9 -1.11,11.4
  rectangle: -2.7,8.9 -2.38,11.4
  rectangle: -3.97,8.9 -3.65,11.4
  rectangle: -5.24,8.9 -4.92,11.4
  rectangle: -6.51,8.9 -6.19,11.4
  rectangle: -7.78,8.9 -7.46,11.4
  rectangle: -11.4,7.46 -8.9,7.78
  rectangle: -11.4,6.19 -8.9,6.51
  rectangle: -11.4,4.92 -8.9,5.24
  rectangle: -11.4,3.65 -8.9,3.97
  rectangle: -11.4,2.38 -8.9,2.7
  rectangle: -11.4,1.11 -8.9,1.43
  rectangle: -11.4,-0.16 -8.9,0.16
  rectangle: -11.4,-1.43 -8.9,-1.11
  rectangle: -11.4,-2.7 -8.9,-2.38
  rectangle: -11.4,-3.97 -8.9,-3.65
  rectangle: -11.4,-5.24 -8.9,-4.92
  rectangle: -11.4,-6.51 -8.9,-6.19
  rectangle: -11.4,-7.78 -8.9,-7.46
Mechanical 27:
  lines w0.2: -12.403,-12.403 12.403,-12.403 12.403,12.403 -12.403,12.403 -12.403,-12.403